# Altium footprint library Lib.PcbLib: 177 footprints (part 4 of 12)
Each footprint in its own frame and in the unit in brackets; x right, y up, seen from the top. Pads: shape width x height; smd on the part's side, far side on the other; paste and mask are expansions set on the pad; w line width, h text height; cw(c..) or ccw(c..) is an arc to the next point about the centre after c.
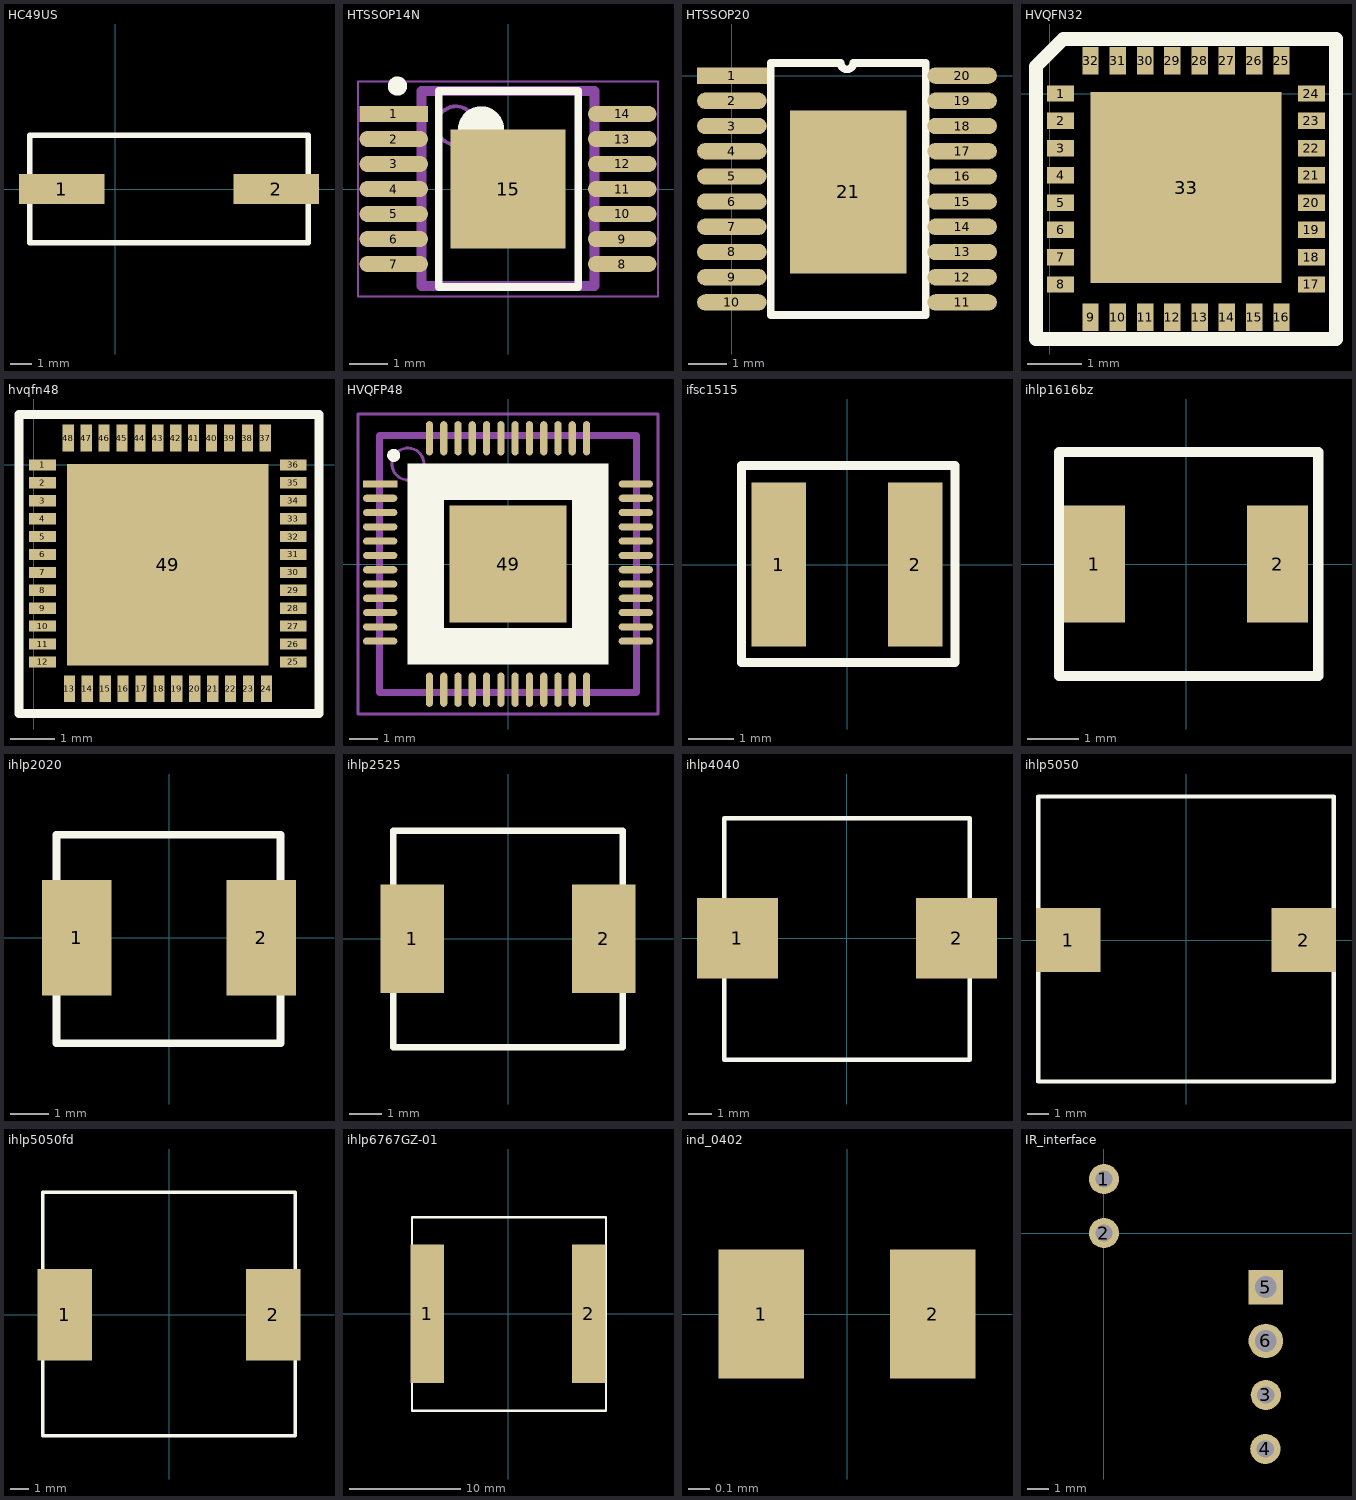
[diagram p3: the footprints below, top view; thin cyan lines are the x and y axes]

## HC49US [mm]
pads (2):
  rect 4x1.4 smd: 1(-2.5,0) 2(7.5,0)
Top Overlay:
  lines w0.254: -4,-2.5 9,-2.5 9,2.5 -4,2.5 -4,-2.5
3D body "User Library-Crystal HC49_US-SM.step": height 4.3, standoff 0, extent -3.825,-2.415 8.975,2.415

## HTSSOP14N [mm] "TSSOP, 14-Leads, Body 5,00x4,40mm, Pitch 0,65mm, IPC Medium Density"
height 1.05
pads (15):
  rect 1.78x0.42 smd: 1(-2.97,1.95)
  oval 1.78x0.42 smd: 2(-2.97,1.3) 3(-2.97,0.65) 4(-2.97,0) 5(-2.97,-0.65) 6(-2.97,-1.3) 7(-2.97,-1.95) 8(2.97,-1.95) 9(2.97,-1.3) 10(2.97,-0.65) 11(2.97,0) 12(2.97,0.65) 13(2.97,1.3) 14(2.97,1.95)
  rect 3x3.1 smd: 15(0,0)
Top Overlay:
  circle w0.25: c-2.875,2.675 r0.125
  circle w0.6: c-0.7,1.55 r0.3
  lines w0.2: -1.8,-2.55 -1.8,2.55 1.825,2.55 1.825,-2.55 -1.8,-2.55
Mechanical 3:
  lines w0.254: -2.25,-2.525 -2.25,2.55 2.25,2.55 2.25,-2.525 -2.25,-2.525
Mechanical 13:
  circle w0.1: c-1.35,1.65 r0.5
  lines w0.1: -2.25,-2.55 -2.25,2.55 2.25,2.55 2.25,-2.55 -2.25,-2.55
Mechanical 15:
  lines w0.05: -3.9,-2.8 -3.9,2.8 3.9,2.8 3.9,-2.8 -3.9,-2.8
  lines w0.1: -0.5,0 0.5,0 ; 0,-0.5 0,0.5
3D body "User Library-HTSSOP14.STEP": height 1.1, standoff 0, extent -3.191,-2.491 3.191,2.491

## HTSSOP20 [mm]
pads (21):
  rect 1.8x0.42 smd: 1(0,0)
  oval 1.8x0.42 smd: 2(0,-0.65) 3(0,-1.3) 4(0,-1.95) 5(0,-2.6) 6(0,-3.25) 7(0,-3.9) 8(0,-4.55) 9(0,-5.2) 10(0,-5.85) 11(5.94,-5.85) 12(5.94,-5.2) 13(5.94,-4.55) 14(5.94,-3.9) 15(5.94,-3.25) 16(5.94,-2.6) 17(5.94,-1.95) 18(5.94,-1.3) 19(5.94,-0.65) 20(5.94,0)
  rect 3x4.2 smd: 21(3,-3)
Top Overlay:
  lines w0.2: 1,-6.175 5,-6.175 5,0.325 3.132,0.325 cw(c2.97,0.325) 2.808,0.325 1,0.325 1,-6.175
3D body "User Library-HTSSOP20.step": height 1, standoff -0.01, extent -0.207,-6.2 6.207,0.3

## HVQFN32 [mm]
pads (33):
  rect 0.5x0.3 smd: 1(0.2,0) 2(0.2,-0.5) 3(0.2,-1) 4(0.2,-1.5) 5(0.2,-2) 6(0.2,-2.5) 7(0.2,-3) 8(0.2,-3.5) 17(4.8,-3.5) 18(4.8,-3) 19(4.8,-2.5) 20(4.8,-2) 21(4.8,-1.5) 22(4.8,-1) 23(4.8,-0.5) 24(4.8,0)
  rect 0.3x0.5 smd: 9(0.75,-4.1) 10(1.25,-4.1) 11(1.75,-4.1) 12(2.25,-4.1) 13(2.75,-4.1) 14(3.25,-4.1) 15(3.75,-4.1) 16(4.25,-4.1) 25(4.25,0.6) 26(3.75,0.6) 27(3.25,0.6) 28(2.75,0.6) 29(2.25,0.6) 30(1.75,0.6) 31(1.25,0.6) 32(0.75,0.6)
  rect 3.5x3.5 smd: 33(2.5,-1.725)
Top Overlay:
  lines w0.254: -0.25,0.5 0.25,1 5.25,1 5.25,-4.5 -0.25,-4.5 -0.25,0.5 ; -0.25,0.5 -0.25,0.5
3D body "SW3dPS-HVQFN-32.STEP": height 0.97, standoff -0.03, extent 0,-4.2 5,0.8

## hvqfn48 [mm]
pads (49):
  rect 0.6x0.25 smd: 1(0.2,0) 2(0.2,-0.4) 3(0.2,-0.8) 4(0.2,-1.2) 5(0.2,-1.6) 6(0.2,-2) 7(0.2,-2.4) 8(0.2,-2.8) 9(0.2,-3.2) 10(0.2,-3.6) 11(0.2,-4) 12(0.2,-4.4) 25(5.8,-4.4) 26(5.8,-4) 27(5.8,-3.6) 28(5.8,-3.2) 29(5.8,-2.8) 30(5.8,-2.4) 31(5.8,-2) 32(5.8,-1.6) 33(5.8,-1.2) 34(5.8,-0.8) 35(5.8,-0.4) 36(5.8,0)
  rect 0.25x0.6 smd: 13(0.8,-5) 14(1.2,-5) 15(1.6,-5) 16(2,-5) 17(2.4,-5) 18(2.8,-5) 19(3.2,-5) 20(3.6,-5) 21(4,-5) 22(4.4,-5) 23(4.8,-5) 24(5.2,-5) 37(5.175,0.6) 38(4.775,0.6) 39(4.375,0.6) 40(3.975,0.6) 41(3.575,0.6) 42(3.175,0.6) 43(2.775,0.6) 44(2.375,0.6) 45(1.975,0.6) 46(1.575,0.6) 47(1.175,0.6) 48(0.775,0.6)
  rect 4.5x4.5 smd: 49(3,-2.225)
Top Overlay:
  lines w0.2: -0.325,-5.55 -0.325,1.125 6.375,1.125 6.375,-5.55 -0.325,-5.55
3D body "User Library-QFN48.step": height 0.85, standoff -0.02, extent -0.02,-5.225 6.02,0.815

## HVQFP48 [mm]
pads (49):
  rect 1.2x0.25 smd: 1(-4.475,2.8)
  oval 1.2x0.25 smd: 2(-4.475,2.3) 3(-4.475,1.8) 4(-4.475,1.3) 5(-4.475,0.8) 6(-4.475,0.3) 7(-4.475,-0.2) 8(-4.475,-0.7) 9(-4.475,-1.2) 10(-4.475,-1.7) 11(-4.475,-2.2) 12(-4.475,-2.7) 25(4.475,-2.7) 26(4.475,-2.2) 27(4.475,-1.7) 28(4.475,-1.2) 29(4.475,-0.7) 30(4.475,-0.2) 31(4.475,0.3) 32(4.475,0.8) 33(4.475,1.3) 34(4.475,1.8) 35(4.475,2.3) 36(4.475,2.8)
  oval 0.25x1.2 smd: 13(-2.75,-4.4) 14(-2.25,-4.4) 15(-1.75,-4.4) 16(-1.25,-4.4) 17(-0.75,-4.4) 18(-0.25,-4.4) 19(0.25,-4.4) 20(0.75,-4.4) 21(1.25,-4.4) 22(1.75,-4.4) 23(2.25,-4.4) 24(2.75,-4.4) 37(2.75,4.4) 38(2.25,4.4) 39(1.75,4.4) 40(1.25,4.4) 41(0.75,4.4) 42(0.25,4.4) 43(-0.25,4.4) 44(-0.75,4.4) 45(-1.25,4.4) 46(-1.75,4.4) 47(-2.25,4.4) 48(-2.75,4.4)
  rect 4.1x4.1 smd: 49(0,0)
Top Overlay:
  region: -3.5,3.5 3.5,3.5 3.5,-3.5 -3.5,-3.5 -3.5,3.5 -2.25,2.25 -2.25,-2.25 2.25,-2.25 2.25,2.25 -2.25,2.25
  lines w0.254: -3.905,3.768 cw(c-4,3.8) -3.9,3.8
Mechanical 11:
  lines w0.254: -4.5,-4.5 -4.5,4.5 4.5,4.5 4.5,-4.5 -4.5,-4.5
Mechanical 13:
  circle w0.1: c-3.5,3.5 r0.559
  lines w0.1: -4.5,-4.461 4.5,-4.461 4.5,4.539 -4.5,4.539 -4.5,-4.461
Mechanical 15:
  lines w0.1: -5.25,-5.25 -5.25,5.25 5.25,5.25 5.25,-5.25 -5.25,-5.25
3D body "User Library-Assem10.step": height 1.56, standoff 0, extent -4.5,-4.461 4.5,4.539

## ifsc1515 [mm]
pads (2):
  rect 1.2x3.6 smd: 1(-1.5,0) 2(1.5,0)
Top Overlay:
  lines w0.2: -2.325,-2.15 -2.325,-0.375 -2.325,2.175 2.375,2.175 2.375,-2.15 -2.325,-2.15
3D body "User Library-IFSC-1515AH.STEP": height 1.8, standoff 0, extent -1.95,-1.925 2,2.025

## ihlp1616bz [mm]
pads (2):
  rect 1.2x2.3 smd: 1(-1.8,0) 2(1.8,0)
Top Overlay:
  lines w0.2: -2.5,-2.2 2.6,-2.2 2.6,2.2 -2.5,2.2 -2.5,0.8 -2.5,-2.2
3D body "User Library-IHLP-1616BZ-01.step": height 2, standoff 0, extent -2.225,-2.03 2.225,2.03

## ihlp2020 [mm]
pads (2):
  rect 1.8x3 smd: 1(-2.4,0) 2(2.4,0)
Top Overlay:
  lines w0.2: -2.925,-2.75 -2.925,0.225 -2.925,2.675 2.9,2.675 2.9,-2.75 -2.925,-2.75
3D body "IHLP2020BZ.STEP": height 1.95, standoff 0.03, extent -2.725,-2.6 2.725,2.546

## ihlp2525 [mm]
pads (2):
  rect 2x3.4 smd: 1(-3,0) 2(3,0)
Top Overlay:
  lines w0.2: -3.6,-3.4 3.6,-3.4 3.6,3.375 -3.6,3.375 -3.6,0.9 -3.6,-3.4
3D body "User Library-IHLP-2525CZ.step": height 3, standoff 0, extent -3.43,-3.235 3.43,3.235

## ihlp4040 [mm]
pads (2):
  rect 3.5x3.5 smd: 1(-4.75,0) 2(4.75,0)
Top Overlay:
  lines w0.2: -5.325,-5.275 5.325,-5.275 5.325,5.2 -5.325,5.2 -5.325,-1.925 -5.325,-5.275
3D body "52668.stp": height 3.88, standoff 0, extent -5.352,-5.161 5.27,5.055

## ihlp5050 [mm]
pads (2):
  rect 3x3 smd: 1(-5.5,0) 2(5.5,0)
Top Overlay:
  lines w0.2: -6.9,-6.6 6.9,-6.6 6.9,6.7 -6.9,6.7 -6.9,-2.55 -6.9,-6.6
3D body "52695.stp": height 3.49, standoff 0.1, extent -6.562,-6.378 6.6,6.378

## ihlp5050fd [mm]
pads (2):
  rect 3x5 smd: 1(-5.7,0) 2(5.7,0)
Top Overlay:
  lines w0.2: -6.9,-6.6 6.9,-6.6 6.9,6.7 -6.9,6.7 -6.9,-2.55 -6.9,-6.6
3D body "User Library-IHLP-5050FD-01.step": height 6.3, standoff 0, extent -6.875,-6.525 6.525,6.375

## ihlp6767GZ-01 [mm]
pads (2):
  rect 3x12.5 smd: 1(-7.3,0) 2(7.3,0)
Top Overlay:
  lines w0.2: -8.675,-8.75 -8.675,-2.425 -8.675,8.725 8.85,8.725 8.85,-8.75 -8.675,-8.75
3D body "IHLP6767GZ.STEP": height 6.89, standoff 0, extent -8.488,-8.6 8.688,8.576

## ind_0402 [mm]
pads (2):
  rect 0.4x0.6 smd: 1(-0.4,0) 2(0.4,0)
3D body "Coilcraft-0402AF-DEFAULT.STEP": height 0.65, standoff -0.01, extent -0.56,-0.256 0.56,0.256

## IR_interface [mm]
height 5
pads (6):
  round 1.4 hole 0.8: 1(0,2.5) 2(0,0) 3(7.5,-7.5) 4(7.475,-10)
  rect 1.6x1.6 hole 1: 5(7.5,-2.5)
  round 1.6 hole 1: 6(7.5,-5)
3D body "User Library-led 3mm white.STEP": height 3.14, standoff -0.15, extent 7.5,-10.294 14.975,-7.081
3D body: height 0.25, standoff 0, extent 7,-9.9 7,-9.9
3D body "User Library-led 3mm black.STEP": height 3.14, standoff -0.15, extent 0,-0.394 7.475,2.82
3D body "User Library-PLS-2R gold.step": height 2.77, standoff -5.85, extent 7.15,-6.31 15.6,-1.23